# Altium footprint library self_pcblib.PcbLib: 94 footprints (part 4 of 6)
Each footprint in its own frame and in the unit in brackets; x right, y up, seen from the top. Pads: shape width x height; smd on the part's side, far side on the other; paste and mask are expansions set on the pad; w line width, h text height; cw(c..) or ccw(c..) is an arc to the next point about the centre after c.
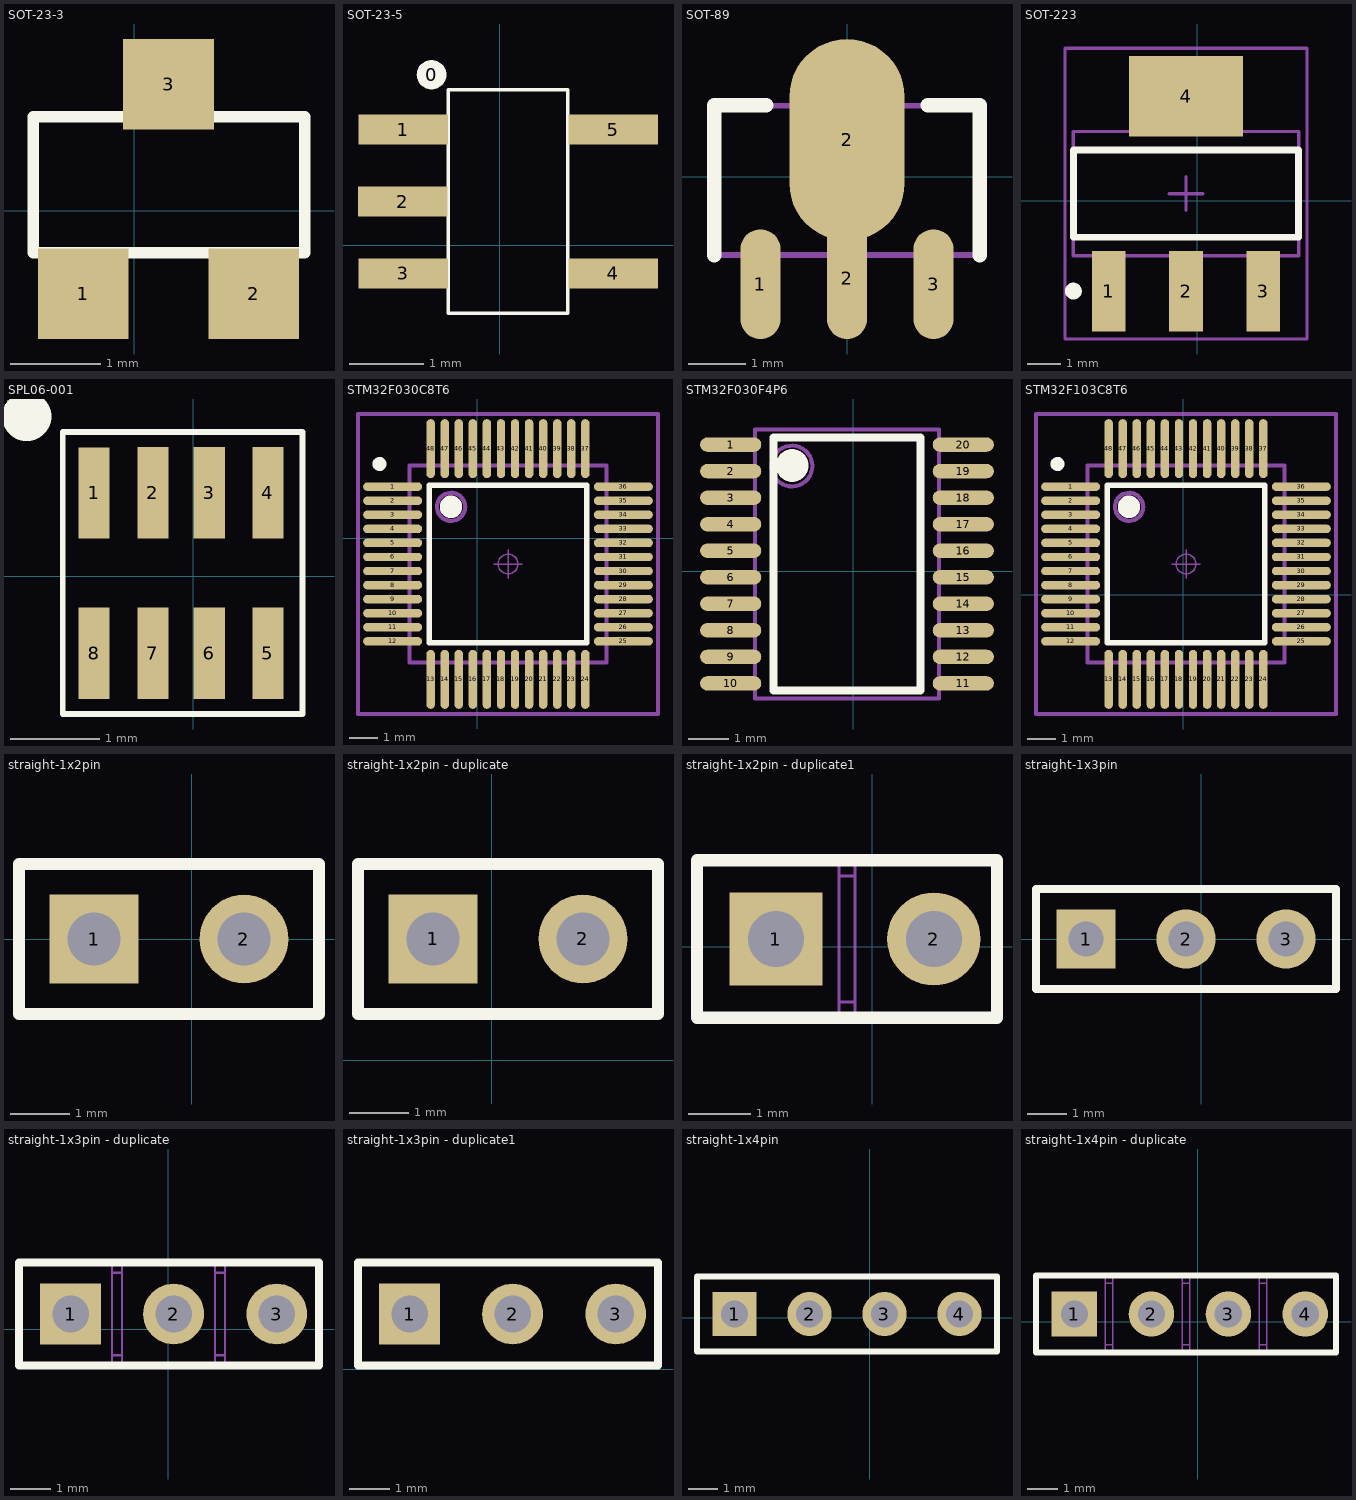
[diagram p3: the footprints below, top view; thin cyan lines are the x and y axes]

## SOT-23-3 [mm]
pads (3):
  rect 1x1 smd: 1(-0.559,-0.914) 2(1.321,-0.914) 3(0.381,1.397)
Top Overlay:
  lines w0.127: -1.114,-0.462 1.886,-0.462 1.886,1.038 -1.114,1.038 -1.114,-0.462
3D body: height 1.2, standoff 0, extent -1.122,-1.146 1.778,1.654

## SOT-23-5 [mil]
pads (6):
  round 15.69 on Top Overlay mask+0: 0(-36,90)
  rect 47.24x15.75 smd: 1(-51,61) 2(-51.24,23) 3(-51,-15) 4(60,-15) 5(60,61)
Top Overlay:
  lines w1.97: -27.11,-36.06 -27.11,82.06 35.88,82.06 35.88,-36.06 -27.11,-36.06
3D body: height 47.24, standoff 0, extent -51.24,-34.09 59,80.09

## SOT-89 [mm]
pads (4):
  oval 0.7x1.9 smd: 1(-1.5,-1.865) 3(1.5,-1.865)
  oval 0.7x2.1 smd: 2(0,-1.765)
  oval 2x3.5 smd: 2(0,0.635)
Top Overlay:
  lines w0.254: -2.3,-1.365 -2.3,1.235 -1.4,1.235 ; 1.4,1.235 2.3,1.235 2.3,-1.365
Mechanical 13:
  lines w0.1: -2.3,-1.36 -2.3,1.23 2.3,1.23 2.3,-1.36 -2.3,-1.36
3D body: height 1.51, standoff 0, extent -2.25,-2.415 2.25,1.885

## SOT-223 [mm]
pads (4):
  rect 1x2.4 smd: 1(-2.635,-2.692) 2(-0.335,-2.692) 3(1.965,-2.692)
  rect 3.4x2.4 smd: 4(-0.335,3.108)
Top Overlay:
  circle w0.25: c-3.685,-2.692 r0.125
  lines w0.2: -3.685,-1.092 3.015,-1.092 3.015,1.508 -3.685,1.508 -3.685,-1.092
Mechanical 13:
  lines w0.1: -3.685,-1.642 3.015,-1.642 3.015,2.058 -3.685,2.058 -3.685,-1.642
Mechanical 15:
  lines w0.1: -0.835,0.208 0.165,0.208 ; -0.335,-0.292 -0.335,0.708 ; -3.935,-4.117 3.265,-4.117 3.265,4.533 -3.935,4.533 -3.935,-4.117
3D body: height 1.65, standoff -0.03, extent -3.635,-3.551 2.865,3.409

## SPL06-001 [mil] "气压计"
pads (8):
  rect 13.78x40.4 smd: 1(-44,37)
  rect 13.78x40.59 smd: 2(-18,37) 5(33,-34) 6(7,-34) 7(-18,-34) 8(-44,-34)
  rect 13.78x40.5 smd: 3(7,37) 4(33,37)
Top Overlay:
  circle w20: c-73.98,71 r0.98
  lines w2.5: -57.94,-61 -57.94,64 48.35,64 48.35,-45.61 48.35,-61 -57.94,-61
3D body: height 25.9, standoff 0, extent -52,-39.5 44,42.5

## STM32F030C8T6 [mm]
pads (48):
  oval 2.1x0.3 smd: 1(-3.008,1.836) 2(-3.008,1.336) 3(-3.008,0.836) 4(-3.008,0.336) 5(-3.008,-0.164) 6(-3.008,-0.664) 7(-3.008,-1.164) 8(-3.008,-1.664) 9(-3.008,-2.164) 10(-3.008,-2.664) 11(-3.008,-3.164) 12(-3.008,-3.664) 25(5.192,-3.664) 26(5.192,-3.164) 27(5.192,-2.664) 28(5.192,-2.164) 29(5.192,-1.664) 30(5.192,-1.164) 31(5.192,-0.664) 32(5.192,-0.164) 33(5.192,0.336) 34(5.192,0.836) 35(5.192,1.336) 36(5.192,1.836)
  oval 0.3x2.1 smd: 13(-1.658,-5.014) 14(-1.158,-5.014) 15(-0.658,-5.014) 16(-0.158,-5.014) 17(0.342,-5.014) 18(0.842,-5.014) 19(1.342,-5.014) 20(1.842,-5.014) 21(2.342,-5.014) 22(2.842,-5.014) 23(3.342,-5.014) 24(3.842,-5.014) 37(3.842,3.186) 38(3.342,3.186) 39(2.842,3.186) 40(2.342,3.186) 41(1.842,3.186) 42(1.342,3.186) 43(0.842,3.186) 44(0.342,3.186) 45(-0.158,3.186) 46(-0.658,3.186) 47(-1.158,3.186) 48(-1.658,3.186)
Top Overlay:
  circle w0.25: c-3.48,2.642 r0.125
  circle w0.6: c-0.935,1.118 r0.1
  lines w0.2: -1.702,-3.708 -1.702,1.88 3.886,1.88 3.886,-3.708 -1.702,-3.708
Mechanical 13:
  circle w0.15: c-0.932,1.118 r0.5
  lines w0.15: -2.408,-4.414 -2.408,2.586 4.592,2.586 4.592,-4.414 -2.408,-4.414
Mechanical 15:
  circle w0.05: c1.092,-0.914 r0.35
  lines w0.05: 0.592,-0.914 1.592,-0.914 ; 1.092,-1.414 1.092,-0.414
  lines w0.15: -4.242,-6.248 -4.242,4.42 6.426,4.42 6.426,-6.248 -4.242,-6.248
3D body: height 1.45, standoff 0, extent -3.408,-5.414 5.592,3.586

## STM32F030F4P6 [mm]
pads (20):
  oval 1.5x0.35 smd: 1(-3.002,3.103) 2(-3.002,2.453) 3(-3.002,1.803) 4(-3.002,1.153) 5(-3.002,0.503) 6(-3.002,-0.147) 7(-3.002,-0.797) 8(-3.002,-1.447) 9(-3.002,-2.097) 10(-3.002,-2.747) 11(2.698,-2.747) 12(2.698,-2.097) 13(2.698,-1.447) 14(2.698,-0.797) 15(2.698,-0.147) 16(2.698,0.503) 17(2.698,1.153) 18(2.698,1.803) 19(2.698,2.453) 20(2.698,3.103)
Top Overlay:
  circle w0.4: c-1.495,2.591 r0.2
  lines w0.2: -1.952,-2.922 1.648,-2.922 1.648,3.278 -1.952,3.278 -1.952,-2.922
Mechanical 13:
  circle w0.1: c-1.502,2.578 r0.5
  lines w0.1: -2.402,-3.122 2.098,-3.122 2.098,3.478 -2.402,3.478 -2.402,-3.122
3D body: height 1.2, standoff 0, extent -3.452,-3.124 3.148,3.476

## STM32F103C8T6 [mm]
pads (48):
  oval 2.1x0.3 smd: 1(-4.008,3.836) 2(-4.008,3.336) 3(-4.008,2.836) 4(-4.008,2.336) 5(-4.008,1.836) 6(-4.008,1.336) 7(-4.008,0.836) 8(-4.008,0.336) 9(-4.008,-0.164) 10(-4.008,-0.664) 11(-4.008,-1.164) 12(-4.008,-1.664) 25(4.192,-1.664) 26(4.192,-1.164) 27(4.192,-0.664) 28(4.192,-0.164) 29(4.192,0.336) 30(4.192,0.836) 31(4.192,1.336) 32(4.192,1.836) 33(4.192,2.336) 34(4.192,2.836) 35(4.192,3.336) 36(4.192,3.836)
  oval 0.3x2.1 smd: 13(-2.658,-3.014) 14(-2.158,-3.014) 15(-1.658,-3.014) 16(-1.158,-3.014) 17(-0.658,-3.014) 18(-0.158,-3.014) 19(0.342,-3.014) 20(0.842,-3.014) 21(1.342,-3.014) 22(1.842,-3.014) 23(2.342,-3.014) 24(2.842,-3.014) 37(2.842,5.186) 38(2.342,5.186) 39(1.842,5.186) 40(1.342,5.186) 41(0.842,5.186) 42(0.342,5.186) 43(-0.158,5.186) 44(-0.658,5.186) 45(-1.158,5.186) 46(-1.658,5.186) 47(-2.158,5.186) 48(-2.658,5.186)
Top Overlay:
  circle w0.6: c-1.935,3.118 r0.1
  circle w0.25: c-4.48,4.642 r0.125
  lines w0.2: -2.702,-1.708 2.886,-1.708 2.886,3.88 -2.702,3.88 -2.702,-1.708
Mechanical 13:
  circle w0.15: c-1.932,3.118 r0.5
  lines w0.15: -3.408,-2.414 3.592,-2.414 3.592,4.586 -3.408,4.586 -3.408,-2.414
Mechanical 15:
  circle w0.05: c0.092,1.086 r0.35
  lines w0.05: -0.408,1.086 0.592,1.086 ; 0.092,0.586 0.092,1.586
  lines w0.15: -5.242,-4.248 5.426,-4.248 5.426,6.42 -5.242,6.42 -5.242,-4.248
3D body: height 1.45, standoff 0, extent -4.408,-3.414 4.592,5.586

## straight-1x2pin [mm]
pads (2):
  rect 1.5x1.5 hole 0.9: 1(-1.651,0)
  round 1.5 hole 0.9: 2(0.889,0)
Top Overlay:
  lines w0.2: -2.921,-1.27 -2.921,1.27 2.159,1.27 2.159,-1.27 -2.921,-1.27
3D body: height 8.54, standoff -3, extent -2.921,-1.27 2.159,1.27

## straight-1x2pin - duplicate [mm]
pads (2):
  rect 1.5x1.5 hole 0.9: 1(-0.991,2.057)
  round 1.5 hole 0.9: 2(1.549,2.057)
Top Overlay:
  lines w0.2: -2.261,0.787 2.819,0.787 2.819,3.327 -2.261,3.327 -2.261,0.787
3D body: height 9.5, standoff -3.2, extent -2.21,0.737 2.87,3.277

## straight-1x2pin - duplicate1 [mm]
pads (2):
  rect 1.5x1.5 hole 0.9: 1(-1.549,0.127)
  round 1.5 hole 0.9: 2(0.991,0.127)
Top Overlay:
  lines w0.2: -2.819,-1.143 2.007,-1.143 2.007,1.397 -0.914,1.397 -2.819,1.397 -2.819,-1.143
Mechanical 1:
  lines w0.05: -0.533,-0.889 -0.279,-0.889 ; -0.533,1.143 -0.279,1.143 ; -2.819,-1.143 -2.819,1.397 -0.533,1.397 -0.533,-1.143 -2.819,-1.143 ; -0.279,-1.143 2.007,-1.143 2.007,1.397 -0.279,1.397 -0.279,-1.143
3D body: height 4, standoff 0, extent -1.896,-0.222 -1.199,0.477
3D body: height 4, standoff 0, extent 0.644,-0.222 1.341,0.477
3D body: height 4, standoff 0, extent 0.644,-0.222 1.341,0.477
3D body: height 4, standoff 0, extent -1.897,-0.222 -1.199,0.476
3D body: height 1.5, standoff 0.2, extent -0.533,-0.889 -0.279,1.143
3D body: height 1.7, standoff 0.2, extent -0.279,-1.143 2.007,1.397
3D body: height 1.7, standoff 0.2, extent -2.819,-1.143 -0.533,1.397

## straight-1x3pin [mm]
pads (3):
  rect 1.5x1.5 hole 0.9: 1(-2.921,0)
  round 1.5 hole 0.9: 2(-0.381,0) 3(2.159,0)
Top Overlay:
  lines w0.2: -4.191,-1.27 3.429,-1.27 3.429,1.27 -4.191,1.27 -4.191,-1.27
3D body: height 8.54, standoff -3, extent -4.191,-1.27 3.429,1.27

## straight-1x3pin - duplicate [mm]
pads (3):
  rect 1.5x1.5 hole 0.9: 1(-2.413,0.381)
  round 1.5 hole 0.9: 2(0.127,0.381) 3(2.667,0.381)
Top Overlay:
  lines w0.2: -3.683,-0.889 -3.683,1.651 -1.778,1.651 3.708,1.651 3.708,-0.889 -3.683,-0.889
Mechanical 1:
  lines w0.05: -1.397,-0.635 -1.143,-0.635 ; -1.397,1.397 -1.143,1.397 ; 1.143,-0.635 1.397,-0.635 ; 1.143,1.397 1.397,1.397 ; -3.683,-0.889 -1.397,-0.889 -1.397,1.651 -3.683,1.651 -3.683,-0.889 ; -1.143,-0.889 -1.143,1.651 1.143,1.651 1.143,-0.889 -1.143,-0.889 ; 1.397,-0.889 1.397,1.651 3.683,1.651 3.683,-0.889 1.397,-0.889
3D body: height 1.7, standoff 0.2, extent -3.683,-0.889 -1.397,1.651
3D body: height 1.7, standoff 0.2, extent -1.143,-0.889 1.143,1.651
3D body: height 1.7, standoff 0.2, extent 1.397,-0.889 3.683,1.651
3D body: height 1.5, standoff 0.2, extent -1.397,-0.635 -1.143,1.397
3D body: height 1.5, standoff 0.2, extent 1.143,-0.635 1.397,1.397
3D body: height 4, standoff 0, extent -2.76,0.032 -2.063,0.73
3D body: height 4, standoff 0, extent -0.22,0.032 0.477,0.731
3D body: height 4, standoff 0, extent 2.32,0.032 3.017,0.731
3D body: height 4, standoff 0, extent 2.32,0.032 3.017,0.731
3D body: height 4, standoff 0, extent -0.22,0.032 0.477,0.731
3D body: height 4, standoff 0, extent -2.76,0.032 -2.063,0.731

## straight-1x3pin - duplicate1 [mm]
pads (3):
  rect 1.5x1.5 hole 0.9: 1(-9.266,1.365)
  round 1.5 hole 0.9: 2(-6.726,1.365) 3(-4.186,1.365)
Top Overlay:
  lines w0.2: -10.536,0.095 -10.536,2.635 -8.631,2.635 -3.144,2.635 -3.144,0.095 -10.536,0.095
Mechanical 1:
  lines w0.05: -8.25,0.095 -10.536,0.095 -10.536,2.635 -8.25,2.635 ; -7.996,0.095 -5.71,0.095 ; -7.996,2.635 -5.71,2.635 ; -5.456,0.095 -3.17,0.095 -3.17,2.635 -5.456,2.635
3D body: height 9.5, standoff -3.2, extent -10.668,0.095 -3.048,2.635

## straight-1x4pin [mm]
pads (4):
  rect 1.5x1.5 hole 0.9: 1(-4.572,0.127)
  round 1.5 hole 0.9: 2(-2.032,0.127) 3(0.508,0.127) 4(3.048,0.127)
Top Overlay:
  lines w0.2: -5.842,-1.143 -5.842,1.397 4.318,1.397 4.318,-1.143 -5.842,-1.143
3D body: height 8.54, standoff -3, extent -5.842,-1.143 4.318,1.397

## straight-1x4pin - duplicate [mm]
pads (4):
  rect 1.5x1.5 hole 0.9: 1(-4.064,0.254)
  round 1.5 hole 0.9: 2(-1.524,0.254) 3(1.016,0.254) 4(3.556,0.254)
Top Overlay:
  lines w0.2: -5.334,-1.016 4.572,-1.016 4.572,1.524 -3.429,1.524 -5.334,1.524 -5.334,-1.016
Mechanical 1:
  lines w0.05: -3.048,-0.762 -2.794,-0.762 ; -3.048,1.27 -2.794,1.27 ; -0.508,-0.762 -0.254,-0.762 ; -0.508,1.27 -0.254,1.27 ; 2.032,-0.762 2.286,-0.762 ; 2.032,1.27 2.286,1.27 ; -5.334,-1.016 -5.334,1.524 -3.048,1.524 -3.048,-1.016 -5.334,-1.016 ; -2.794,-1.016 -0.508,-1.016 -0.508,1.524 -2.794,1.524 -2.794,-1.016 ; -0.254,-1.016 2.032,-1.016 2.032,1.524 -0.254,1.524 -0.254,-1.016 ; 2.286,-1.016 4.572,-1.016 4.572,1.524 2.286,1.524 2.286,-1.016
3D body: height 4, standoff 0, extent -4.411,-0.095 -3.714,0.604
3D body: height 4, standoff 0, extent -1.871,-0.095 -1.174,0.604
3D body: height 4, standoff 0, extent 0.669,-0.095 1.366,0.604
3D body: height 4, standoff 0, extent 3.209,-0.095 3.906,0.604
3D body: height 4, standoff 0, extent 3.209,-0.095 3.906,0.604
3D body: height 4, standoff 0, extent 0.669,-0.095 1.366,0.604
3D body: height 4, standoff 0, extent -1.871,-0.095 -1.174,0.604
3D body: height 4, standoff 0, extent -4.411,-0.095 -3.714,0.603
3D body: height 1.5, standoff 0.2, extent 2.032,-0.762 2.286,1.27
3D body: height 1.5, standoff 0.2, extent -0.508,-0.762 -0.254,1.27
3D body: height 1.5, standoff 0.2, extent -3.048,-0.762 -2.794,1.27
3D body: height 1.7, standoff 0.2, extent 2.286,-1.016 4.572,1.524
3D body: height 1.7, standoff 0.2, extent -0.254,-1.016 2.032,1.524
3D body: height 1.7, standoff 0.2, extent -2.794,-1.016 -0.508,1.524
3D body: height 1.7, standoff 0.2, extent -5.334,-1.016 -3.048,1.524